# Altium footprint library Connectors.PcbLib: 245 footprints (part 6 of 16)
Each footprint in its own frame and in the unit in brackets; x right, y up, seen from the top. Pads: shape width x height; smd on the part's side, far side on the other; paste and mask are expansions set on the pad; w line width, h text height; cw(c..) or ccw(c..) is an arc to the next point about the centre after c.
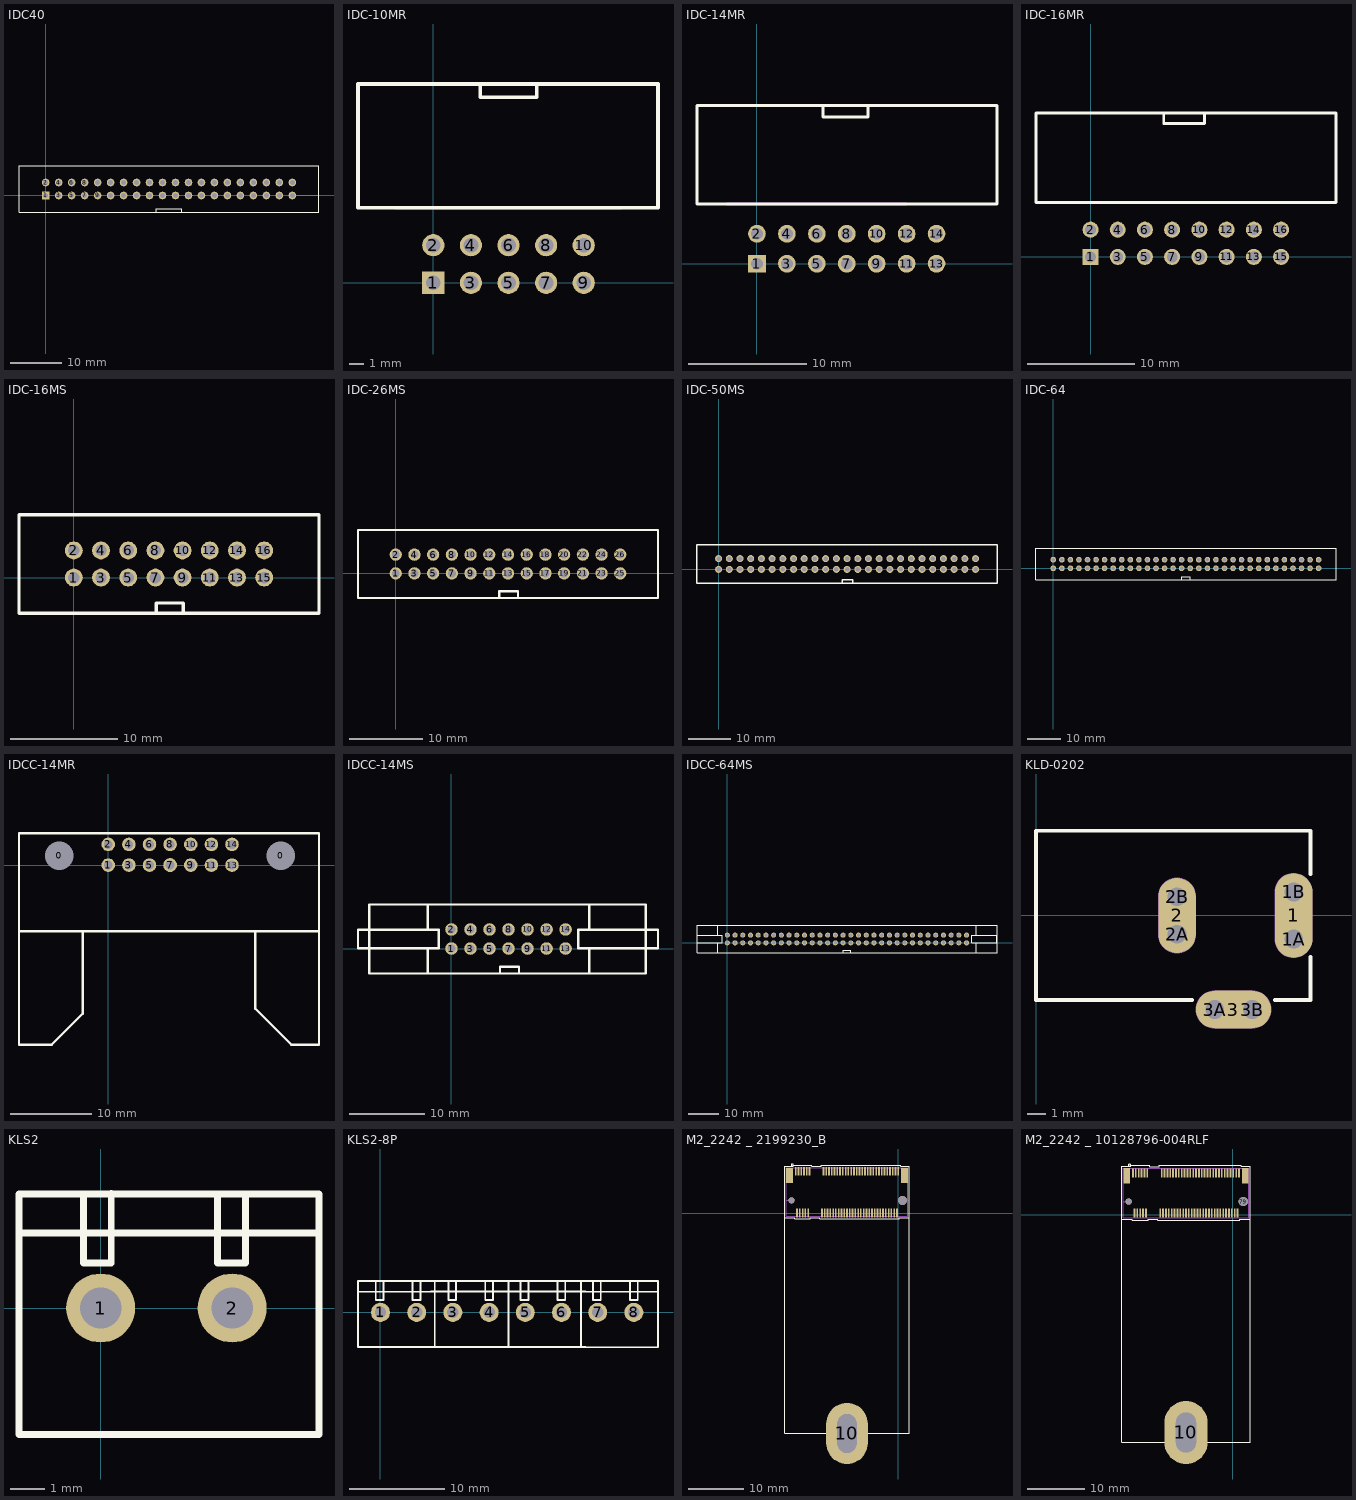
[diagram p5: the footprints below, top view; thin cyan lines are the x and y axes]

## IDC40 [mm]
pads (40):
  rect 1.5x1.5 hole 1: 1(0,0)
  round 1.5 hole 1: 2(0,2.54) 3(2.54,0) 4(2.54,2.54) 5(5.08,0) 6(5.08,2.54) 7(7.62,0) 8(7.62,2.54) 9(10.16,0) 10(10.16,2.54) 11(12.7,0) 12(12.7,2.54) 13(15.24,0) 14(15.24,2.54) 15(17.78,0) 16(17.78,2.54) 17(20.32,0) 18(20.32,2.54) 19(22.86,0) 20(22.86,2.54) 21(25.4,0) 22(25.4,2.54) 23(27.94,0) 24(27.94,2.54) 25(30.48,0) 26(30.48,2.54) 27(33.02,0) 28(33.02,2.54) 29(35.56,0) 30(35.56,2.54) 31(38.1,0) 32(38.1,2.54) 33(40.64,0) 34(40.64,2.54) 35(43.18,0) 36(43.18,2.54) 37(45.72,0) 38(45.72,2.54) 39(48.26,0) 40(48.26,2.54)
Top Overlay:
  lines w0.15: 21.59,-3.25 21.59,-2.55 26.59,-2.55 26.59,-3.25 ; -5.22,-3.28 -5.22,5.82 53.48,5.82 53.48,-3.28 -5.22,-3.28
Mechanical 1:
  lines w0.15: 48.26,0 53.48,0
3D body "User Library-DS1013-40S (IDC-40MS CONNFLY).step": height 9, standoff -3.6, extent -5.17,-3.23 53.43,5.67

## IDC-10MR [mm]
height 10
pads (10):
  rect 1.5x1.5 hole 1: 1(0,0)
  round 1.5 hole 1: 2(0,2.54) 3(2.54,0) 4(2.54,2.54) 5(5.08,0) 6(5.08,2.54) 7(7.62,0) 8(7.62,2.54) 9(10.16,0) 10(10.16,2.54)
Top Overlay:
  lines w0.254: 3.175,13.41 3.175,12.54 6.985,12.54 6.985,13.41 ; -5.09,5.08 15.18,5.08 15.18,13.43 -5.09,13.43 -5.09,5.08
Mechanical 1:
  lines w0.254: -2.54,5.08 12.65,5.08
3D body "User Library-BHR-10___64-1.step": height 9.5, standoff -2.7, extent -5.09,-0.311 15.27,13.231

## IDC-14MR [mm]
height 10
pads (14):
  rect 1.5x1.5 hole 1: 1(0,0)
  round 1.5 hole 1: 2(0,2.54) 3(2.54,0) 4(2.54,2.54) 5(5.08,0) 6(5.08,2.54) 7(7.62,0) 8(7.62,2.54) 9(10.16,0) 10(10.16,2.54) 11(12.7,0) 12(12.7,2.54) 13(15.24,0) 14(15.24,2.54)
Top Overlay:
  lines w0.254: 5.611,13.309 5.611,12.439 9.421,12.439 9.421,13.309 ; 20.339,5.08 -5.09,5.08 -5.09,13.43 20.37,13.43 20.37,5.08
Mechanical 1:
  lines w0.254: -2.54,5.08 12.65,5.08
3D body "User Library-DS1013-14R (IDC-14R CONNFLY).step": height 9, standoff -2.9, extent -5.103,-0.329 20.477,13.691

## IDC-16MR [mm]
height 10
pads (16):
  rect 1.5x1.5 hole 1: 1(0,0)
  round 1.5 hole 1: 2(0,2.54) 3(2.54,0) 4(2.54,2.54) 5(5.08,0) 6(5.08,2.54) 7(7.62,0) 8(7.62,2.54) 9(10.16,0) 10(10.16,2.54) 11(12.7,0) 12(12.7,2.54) 13(15.24,0) 14(15.24,2.54) 15(17.78,0) 16(17.78,2.54)
Top Overlay:
  lines w0.254: 6.835,13.33 6.835,12.46 10.645,12.46 10.645,13.33 ; -5.09,5.08 -5.09,13.43 22.91,13.43 22.91,5.08 -5.09,5.08
Mechanical 1:
  lines w0.254: -2.54,5.08 12.65,5.08
3D body "User Library-IDC Socket Male 16pin Angled THT Goldplated 2_54mm.step": height 8.98, standoff -2.37, extent -5.4,-0.3 23.16,13.26

## IDC-16MS [mm] "BH-16 (DS1013-16S) (IDC-16MS), Вилка прямая"
pads (16):
  round 1.67 hole 1.07: 1(0,0) 2(0,2.54) 3(2.54,0) 4(2.54,2.54) 5(5.08,0) 6(5.08,2.54) 7(7.62,0) 8(7.62,2.54) 9(10.16,0) 10(10.16,2.54) 11(12.7,0) 12(12.7,2.54) 13(15.24,0) 14(15.24,2.54) 15(17.78,0) 16(17.78,2.54)
Top Overlay:
  lines w0.3: 7.69,-3.21 7.69,-2.37 10.19,-2.37 ; 10.23,-3.25 10.23,-2.37 ; -5.12,-3.33 22.9,-3.33 22.9,5.87 -5.12,5.87 -5.12,-3.33
3D body "User Library-IDC Socket Male 16pin Straight THT Goldplated 2_54mm.step": height 9.63, standoff -2.77, extent -5.08,-2.99 22.84,5.86

## IDC-26MS [mm] "BH-26 (DS1013-26S) (IDC-26MS), Вилка прямая"
pads (26):
  round 1.67 hole 1.07: 1(0,0) 2(0,2.54) 3(2.54,0) 4(2.54,2.54) 5(5.08,0) 6(5.08,2.54) 7(7.62,0) 8(7.62,2.54) 9(10.16,0) 10(10.16,2.54) 11(12.7,0) 12(12.7,2.54) 13(15.24,0) 14(15.24,2.54) 15(17.78,0) 16(17.78,2.54) 17(20.32,0) 18(20.32,2.54) 19(22.86,0) 20(22.86,2.54) 21(25.4,0) 22(25.4,2.54) 23(27.94,0) 24(27.94,2.54) 25(30.48,0) 26(30.48,2.54)
Top Overlay:
  lines w0.3: 14.05,-3.28 14.05,-2.44 16.55,-2.44 ; 16.59,-3.32 16.59,-2.44 ; -5.12,-3.33 35.6,-3.33 35.6,5.87 -5.12,5.87 -5.12,-3.33
3D body "User Library-IDC Socket Male 26pin Straight THT Goldplated 2_54mm.step": height 9.63, standoff -2.77, extent -5.07,-2.98 35.55,5.87

## IDC-50MS [mm] "BH-50 (DS1013-50S) (IDC-50MS), Вилка прямая"
pads (50):
  round 1.67 hole 1.07: 1(0,0) 2(0,2.54) 3(2.54,0) 4(2.54,2.54) 5(5.08,0) 6(5.08,2.54) 7(7.62,0) 8(7.62,2.54) 9(10.16,0) 10(10.16,2.54) 11(12.7,0) 12(12.7,2.54) 13(15.24,0) 14(15.24,2.54) 15(17.78,0) 16(17.78,2.54) 17(20.32,0) 18(20.32,2.54) 19(22.86,0) 20(22.86,2.54) 21(25.4,0) 22(25.4,2.54) 23(27.94,0) 24(27.94,2.54) 25(30.48,0) 26(30.48,2.54) 27(33.02,0) 28(33.02,2.54) 29(35.56,0) 30(35.56,2.54) 31(38.1,0) 32(38.1,2.54) 33(40.64,0) 34(40.64,2.54) 35(43.18,0) 36(43.18,2.54) 37(45.72,0) 38(45.72,2.54) 39(48.26,0) 40(48.26,2.54) 41(50.8,0) 42(50.8,2.54) 43(53.34,0) 44(53.34,2.54) 45(55.88,0) 46(55.88,2.54) 47(58.42,0) 48(58.42,2.54) 49(60.96,0) 50(60.96,2.54)
Top Overlay:
  lines w0.3: 29.29,-3.28 29.29,-2.44 31.79,-2.44 ; 31.83,-3.32 31.83,-2.44 ; -5.12,-3.33 66.05,-3.33 66.05,5.87 -5.12,5.87 -5.12,-3.33
3D body "User Library-302-S501.STEP": height 8.8, standoff -3.6, extent -5.17,-3.08 66.23,6.02

## IDC-64 [mm]
pads (64):
  round 1.67 hole 1.07: 1(0,0) 2(0,2.54) 3(2.54,0) 4(2.54,2.54) 5(5.08,0) 6(5.08,2.54) 7(7.62,0) 8(7.62,2.54) 9(10.16,0) 10(10.16,2.54) 11(12.7,0) 12(12.7,2.54) 13(15.24,0) 14(15.24,2.54) 15(17.78,0) 16(17.78,2.54) 17(20.32,0) 18(20.32,2.54) 19(22.86,0) 20(22.86,2.54) 21(25.4,0) 22(25.4,2.54) 23(27.94,0) 24(27.94,2.54) 25(30.48,0) 26(30.48,2.54) 27(33.02,0) 28(33.02,2.54) 29(35.56,0) 30(35.56,2.54) 31(38.1,0) 32(38.1,2.54) 33(40.64,0) 34(40.64,2.54) 35(43.18,0) 36(43.18,2.54) 37(45.72,0) 38(45.72,2.54) 39(48.26,0) 40(48.26,2.54) 41(50.8,0) 42(50.8,2.54) 43(53.34,0) 44(53.34,2.54) 45(55.88,0) 46(55.88,2.54) 47(58.42,0) 48(58.42,2.54) 49(60.96,0) 50(60.96,2.54) 51(63.5,0) 52(63.5,2.54) 53(66.04,0) 54(66.04,2.54) 55(68.58,0) 56(68.58,2.54) 57(71.12,0) 58(71.12,2.54) 59(73.66,0) 60(73.66,2.54) 61(76.2,0) 62(76.2,2.54) 63(78.74,0) 64(78.74,2.54)
Top Overlay:
  lines w0.3: 38.1,-3.29 38.1,-2.45 40.6,-2.45 ; 40.64,-3.33 40.64,-2.45 ; -5.12,-3.33 -5.12,5.87 83.88,5.87 83.88,-3.33 -5.12,-3.33

## IDCC-14MR [mm]
pads (16):
  round 1.5 hole 3.5: 0(-6.025,1.15) 0(21.26,1.15)
  round 1.67 hole 1.07: 1(0,0) 2(0,2.54) 3(2.54,0) 4(2.54,2.54) 5(5.08,0) 6(5.08,2.54) 8(7.62,2.54) 9(10.16,0) 10(10.16,2.54) 11(12.7,0) 12(12.7,2.54) 13(15.24,0) 14(15.24,2.54)
  round 1.7 hole 1.1: 7(7.62,0)
Top Overlay:
  lines w0.3: -10.99,-3.33 -10.99,3.925 ; -10.95,-8.13 25.95,-8.13 ; -3.15,-8.155 -3.15,-18.31 -6.97,-22.13 -10.99,-22.13 -10.99,3.925 ; 18.11,-8.155 18.11,-17.695 22.545,-22.13 25.95,-22.13 25.95,3.925 ; 25.95,-3.33 25.95,3.925 ; -10.99,3.925 25.95,3.925
3D body "3-1437049-3.stp": height 9.45, standoff 0.23, extent -12.875,-19.542 27.525,3.726

## IDCC-14MS [mm]
pads (14):
  round 1.67 hole 1.07: 1(0,0) 2(0,2.54) 3(2.54,0) 4(2.54,2.54) 5(5.08,0) 6(5.08,2.54) 7(7.62,0) 8(7.62,2.54) 9(10.16,0) 10(10.16,2.54) 11(12.7,0) 12(12.7,2.54) 13(15.24,0) 14(15.24,2.54)
Top Overlay:
  lines w0.3: -3.15,-3.226 -3.15,0.051 ; -3.15,2.565 -3.15,5.842 ; 6.47,-3.26 6.47,-2.42 8.97,-2.42 ; 9.01,-3.3 9.01,-2.42 ; 18.39,-3.226 18.39,0.051 ; 18.39,2.565 18.39,5.842 ; -12.48,0.051 -1.702,0.051 -1.702,2.515 -12.48,2.515 -12.48,0.051 ; -10.99,-3.33 25.95,-3.33 25.95,5.87 -10.99,5.87 -10.99,-3.33 ; 16.942,0.051 27.58,0.051 27.58,2.515 16.942,2.515 16.942,0.051
3D body "3-1437049-3.stp": height 20.46, standoff -2.81, extent -12.66,-3.225 27.741,5.994

## IDCC-64MS [mm]
pads (64):
  round 1.67 hole 1.07: 1(0,0) 2(0,2.54) 3(2.54,0) 4(2.54,2.54) 5(5.08,0) 6(5.08,2.54) 7(7.62,0) 8(7.62,2.54) 9(10.16,0) 10(10.16,2.54) 11(12.7,0) 12(12.7,2.54) 13(15.24,0) 14(15.24,2.54) 15(17.78,0) 16(17.78,2.54) 17(20.32,0) 18(20.32,2.54) 19(22.86,0) 20(22.86,2.54) 21(25.4,0) 22(25.4,2.54) 23(27.94,0) 24(27.94,2.54) 25(30.48,0) 26(30.48,2.54) 27(33.02,0) 28(33.02,2.54) 29(35.56,0) 30(35.56,2.54) 31(38.1,0) 32(38.1,2.54) 33(40.64,0) 34(40.64,2.54) 35(43.18,0) 36(43.18,2.54) 37(45.72,0) 38(45.72,2.54) 39(48.26,0) 40(48.26,2.54) 41(50.8,0) 42(50.8,2.54) 43(53.34,0) 44(53.34,2.54) 45(55.88,0) 46(55.88,2.54) 47(58.42,0) 48(58.42,2.54) 49(60.96,0) 50(60.96,2.54) 51(63.5,0) 52(63.5,2.54) 53(66.04,0) 54(66.04,2.54) 55(68.58,0) 56(68.58,2.54) 57(71.12,0) 58(71.12,2.54) 59(73.66,0) 60(73.66,2.54) 61(76.2,0) 62(76.2,2.54) 63(78.74,0) 64(78.74,2.54)
Top Overlay:
  lines w0.3: -3.15,-3.226 -3.15,0.051 ; -3.15,2.565 -3.15,5.842 ; 38.1,-3.29 38.1,-2.45 40.6,-2.45 ; 40.64,-3.33 40.64,-2.45 ; 81.915,-3.226 81.915,0.051 ; 81.915,2.565 81.915,5.842 ; -9.982,-3.33 88.748,-3.33 88.748,5.87 -9.982,5.87 -9.982,-3.33 ; -9.957,0.051 -1.702,0.051 -1.702,2.515 -9.957,2.515 -9.957,0.051 ; 80.467,0.051 80.467,2.515 88.722,2.515 88.722,0.051 80.467,0.051

## KLD-0202 [mm] "DC Power Jack, 2.5mm, KLD Series, PCB Mount"
pads (9):
  oval 2x4.5 all layers, no hole: 1(13.7,0)
  round 1.5 hole 1: 1A(13.7,-1.25) 1B(13.7,1.25) 2A(7.5,-1) 2B(7.5,1) 3A(9.5,-5) 3B(11.5,-5)
  oval 2x4 all layers, no hole: 2(7.5,0)
  oval 4x2 all layers, no hole: 3(10.5,-5)
Top Overlay:
  lines w0.2: 8.3,-4.5 0,-4.5 0,4.5 14.6,4.5 14.6,2.2 ; 12.7,-4.5 14.6,-4.5 14.6,-2.2
Mechanical 1:
  lines w1: 7.5,-1 7.5,1 ; 9.5,-5 11.5,-5 ; 13.7,-1.25 13.7,1.25
  text "Alert PCB fab to slot details" at 0.286,6.066 h0.3
  text "Assign keep-out area to slot" at 0.286,6.566 h0.3
  text "Mech 1 - Slot cut-out" at 0.286,5.566 h0.3
  text "Mech 2 - Clearance, move to internal plane if present" at 0.286,5.066 h0.3
Mechanical 2:
  lines w2.016: 7.5,-1 7.5,1 ; 9.5,-5 11.5,-5 ; 13.7,-1.25 13.7,1.25

## KLS2 [mm] "колодка клеммная 3.81"
pads (2):
  round 2 hole 1.2: 1(0,0) 2(3.81,0)
Top Overlay:
  lines w0.2: -2.348,2.176 6.327,2.176 ; -0.5,3.3 -0.5,1.3 0.306,1.3 0.306,3.317 ; 3.384,3.3 3.384,1.3 4.191,1.3 4.191,3.3 ; -2.368,-3.663 -2.368,3.305 6.327,3.305 6.327,-3.663 -2.368,-3.663
3D body "User Library-KLS2-340-3_81-1.STEP": height 8.4, standoff -3.27, extent -2.293,-3.663 6.327,3.337

## KLS2-8P [mm]
pads (8):
  round 2 hole 1.2: 1(0,0) 2(3.81,0) 3(7.62,0) 4(11.43,0) 5(15.24,0) 6(19.05,0) 7(22.86,0) 8(26.67,0)
Top Overlay:
  lines w0.2: -2.368,3.301 29.21,3.301 29.21,-3.667 20.515,-3.667 ; -2.368,3.305 -2.368,-3.663 5.707,-3.663 5.707,3.305 ; -2.348,2.176 6.327,2.176 ; -0.5,3.3 -0.5,1.3 0.306,1.3 0.306,3.317 ; 3.384,3.3 3.384,1.3 4.191,1.3 4.191,3.3 ; 5.278,-3.651 13.454,-3.651 13.454,3.317 ; 5.298,2.188 13.973,2.188 ; 7.146,3.312 7.146,1.312 7.952,1.312 7.952,3.329 ; 11.03,3.312 11.03,1.312 11.837,1.312 11.837,3.312 ; 12.885,-3.646 21.58,-3.646 ; 12.905,2.193 21.58,2.193 ; 14.753,3.317 14.753,1.317 15.559,1.317 15.559,3.334 ; 18.637,3.317 18.637,1.317 19.444,1.317 19.444,3.317 ; 20.535,2.172 29.21,2.172 ; 21.084,-3.672 21.084,3.296 ; 22.383,3.296 22.383,1.296 23.189,1.296 23.189,3.313 ; 26.267,3.296 26.267,1.296 27.074,1.296 27.074,3.296
3D body "User Library-KLS2-340-3_81-1.STEP": height 8.4, standoff -3.27, extent 20.59,-3.667 29.21,3.333
3D body "User Library-KLS2-340-3_81-1.STEP": height 8.4, standoff -3.27, extent 12.96,-3.646 21.58,3.354
3D body "User Library-KLS2-340-3_81-1.STEP": height 8.4, standoff -3.27, extent 5.353,-3.651 13.973,3.349
3D body "User Library-KLS2-340-3_81-1.STEP": height 8.4, standoff -3.27, extent -2.293,-3.663 6.327,3.337

## M2_2242 _ 2199230_B [mil] "M.2 slot key B"
pads (72):
  rect 12x61 smd paste+0 mask+0: 1(-728.35,297.24) 2(-718.5,0) 3(-708.66,297.24) 4(-698.82,0) 5(-688.98,297.24) 6(-679.13,0) 7(-669.29,297.24) 8(-659.45,0) 9(-649.61,297.24) 10(-639.76,0) 11(-629.92,297.24) 20(-541.34,0) 21(-531.5,297.24) 22(-521.65,0) 23(-511.81,297.24) 24(-501.97,0) 25(-492.13,297.24) 26(-482.28,0) 27(-472.44,297.24) 28(-462.6,0) 29(-452.76,297.24) 30(-442.91,0) 31(-433.07,297.24) 32(-423.23,0) 33(-413.39,297.24) 34(-403.54,0) 35(-393.7,297.24) 36(-383.86,0) 37(-374.02,297.24) 38(-364.17,0) 39(-354.33,297.24) 40(-344.49,0) 41(-334.65,297.24) 42(-324.8,0) 43(-314.96,297.24) 44(-305.12,0) 45(-295.28,297.24) 46(-285.43,0) 47(-275.59,297.24) 48(-265.75,0) 49(-255.91,297.24) 50(-246.06,0) 51(-236.22,297.24) 52(-226.38,0) 53(-216.54,297.24) 54(-206.69,0) 55(-196.85,297.24) 56(-187.01,0) 57(-177.17,297.24) 58(-167.32,0) 59(-157.48,297.24) 60(-147.64,0) 61(-137.8,297.24) 62(-127.95,0) 63(-118.11,297.24) 64(-108.27,0) 65(-98.43,297.24) 66(-88.58,0) 67(-78.74,297.24) 68(-68.9,0) 69(-59.06,297.24) 70(-49.21,0) 71(-39.37,297.24) 72(-29.53,0) 73(-19.68,297.24) 74(-9.84,0) 75(0,297.24)
  oval 295.28x433.07 hole 275.59 slot 137.8 at 0 deg unplated: 10(-364.17,-1563.98)
  rect 47x108 smd: 76(-771.65,266.73) 77(43.31,266.73)
  round 43 hole 43: 78(-757.87,89.57)
  round 63 hole 63: 79(29.53,89.57)
Top Overlay:
  circle w3.94: c-753.07,339.8 r7.87
  lines w5.91: -805.22,-1406.5 -805.22,89.57 -805.22,-1563.98 -364.17,-1563.98 76.87,-1563.98 76.87,89.57 76.87,-1406.5
  lines w6: -805.15,202.73 -805.15,330.73 -744.35,330.73 -744.35,337.74 -613.92,337.74 -613.92,330.12 -547.5,330.12 -547.5,337.74 -94.74,337.74 16,337.74 16,330.73 76.81,330.73 76.81,202.73 76.83,202.73 76.83,-32.88 6.16,-32.88 6.16,-40.5 -557.34,-40.5 -557.34,-32.88 -623.76,-32.88 -623.76,-40.5 -734.5,-40.5 -734.5,-32.88 -805.17,-32.88 -805.17,202.73 ; -805.17,202.73 -805.15,202.73
Mechanical 1:
  lines w3.94: -797.24,89.57 -757.87,89.57 ; 29.53,89.57 68.9,89.57
Mechanical 13:
  lines w1: -795.17,-22.88 66.83,-22.88 66.83,320.12 -795.17,320.12 -795.17,-22.88
3D body "c-2199230-5-b2-3d.stp": height 160.83, standoff -24.21, extent -795.67,-21.9 66.53,320.62
3D body: height 10, standoff 0, extent 0,0 10,10

## M2_2242 _ 10128796-004RLF [mil] "M.2 slot key B"
pads (72):
  rect 12x61 smd paste+0 mask+0: 1(-683.94,286.77) 3(-664.25,286.77) 4(-654.41,13.14) 5(-644.57,286.77) 6(-634.72,13.14) 7(-624.88,286.77) 8(-615.04,13.14) 9(-605.2,286.77) 10(-595.35,13.14) 11(-585.51,286.77) 20(-496.93,13.14) 21(-487.09,286.77) 22(-477.24,13.14) 23(-467.4,286.77) 24(-457.56,13.14) 25(-447.72,286.77) 26(-437.87,13.14) 27(-428.03,286.77) 28(-418.19,13.14) 29(-408.35,286.77) 30(-398.5,13.14) 31(-388.66,286.77) 32(-378.82,13.14) 33(-368.98,286.77) 34(-359.13,13.14) 35(-349.29,286.77) 36(-339.45,13.14) 37(-329.61,286.77) 38(-319.76,13.14) 39(-309.92,286.77) 40(-300.08,13.14) 41(-290.24,286.77) 42(-280.39,13.14) 43(-270.55,286.77) 44(-260.71,13.14) 45(-250.87,286.77) 46(-241.02,13.14) 47(-231.18,286.77) 48(-221.34,13.14) 49(-211.5,286.77) 50(-201.65,13.14) 51(-191.81,286.77) 52(-181.97,13.14) 53(-172.13,286.77) 54(-162.28,13.14) 55(-152.44,286.77) 56(-142.6,13.14) 57(-132.76,286.77) 58(-122.91,13.14) 59(-113.07,286.77) 60(-103.23,13.14) 61(-93.39,286.77) 62(-83.54,13.14) 63(-73.7,286.77) 64(-63.86,13.14) 65(-54.02,286.77) 66(-44.17,13.14) 67(-34.33,286.77) 68(-24.49,13.14) 69(-14.65,286.77) 70(-4.8,13.14) 71(5.04,286.77) 72(14.88,13.14) 73(24.72,286.77) 74(34.57,13.14) 75(44.41,286.77)
  rect 12x60.98 smd paste+0 mask+0: 2(-674.09,13.15)
  oval 295.28x433.07 hole 275.59 slot 137.8 at 0 deg unplated: 10(-319.76,-1496.06)
  rect 47x108 smd: 76(-727.24,268.07) 77(87.72,268.07)
  round 43 hole 43: 78(-713.46,90.91)
  round 63 hole 63: 79(73.94,90.91)
Top Overlay:
  circle w3.94: c-708.66,341.14 r7.87
  lines w5.91: -760.81,-1405.16 -760.81,90.91 -760.81,-1562.64 -319.76,-1562.64 121.28,-1562.64 121.28,90.91 121.28,-1405.16 ; -760.76,-31.54 -690.09,-31.54
  lines w6: -760.76,204.07 -760.74,204.07 ; -760.76,204.07 -760.76,-31.54 -690.09,-31.54 -690.09,-39.16 -579.35,-39.16 -579.35,-31.54 -512.93,-31.54 -512.93,-39.16 50.57,-39.16 50.57,-31.54 121.24,-31.54 121.24,204.07 121.22,204.07 121.22,332.07 60.41,332.07 60.41,339.08 -50.33,339.08 -503.09,339.08 -503.09,331.46 -569.51,331.46 -569.51,339.08 -699.94,339.08 -699.94,332.07 -760.74,332.07 -760.74,204.07
Mechanical 1:
  lines w3.94: -752.83,90.91 -713.46,90.91 ; 73.94,90.91 113.31,90.91
Mechanical 13:
  lines w1: -750.76,-21.54 -750.76,321.46 111.24,321.46 111.24,-21.54 -750.76,-21.54
3D body "2242_B_M.step": height 340.55, standoff 202.76, extent -753.19,-1481.14 112.95,172.4
3D body "10128796_1.stp": height 334.65, standoff -23.62, extent -749.44,21.34 110.79,283.15
3D body: height 10, standoff 0, extent 44.41,1.34 54.41,11.34